# Altium footprint library 6-Connectors-3.PcbLib: 153 footprints (part 7 of 11) (continued)
## PHOENIX_1861073 [mm] "COMBICON PCB Male Header, Pitch 5mm, 4 Positions, Right"
height 16
pads (4):
  round 2.1 hole 1.4: 5(-7.5,0) 6(-2.5,0) 7(2.5,0) 8(7.5,0)
Top Overlay:
  lines w0.2: -9,3.5 1.37,3.5 ; -8.039,-1.4 -9,-1.4 -9,5.157 -7.28,6.15 -6.3,6.15 ; -7.8,5.85 -7.8,5.15 -6.3,5.15 ; -6.961,-1.4 -3.039,-1.4 ; -6.3,7.15 -7.28,7.15 -7.8,7.45 -7.8,8.15 -6.3,8.15 ; -3.9,5.05 -3.9,6.05 -1.1,6.05 -1.1,5.05 ; -3.712,5.05 -3.712,6.05 ; -3.2,3.5 -3.2,2.5 -3,2.7 ; -3,1.414 -3,3.5 ; -3,2.5 -6,2.5 cw(c-6,2.8) -6.3,2.8 -6.3,10.25 -7.2,10.25 -7.2,11.876 -6.7,13.25 -5.905,13.25 -5.593,12.087 -5.593,5.05 -0.3,5.05 -0.3,12.13 0,13.25 7.5,13.25 7.5,12.35 6.98,12.05 1.37,12.05 1.37,2.8 cw(c1.07,2.8) 1.07,2.5 -2,2.5 ; -3,6.05 -3,11.05 ; -2,1.414 -2,3.5 ; -2,2.7 -1.8,2.5 -1.8,3.5 ; -2,6.05 -2,11.05 ; -1.961,-1.4 1.961,-1.4 ; -1.288,5.05 -1.288,6.05 ; -1.086,-0.5 1.086,-0.5 ; -1.086,0.5 1.086,0.5 ; 3.039,-1.4 6.8,-1.4 ; 3.914,-0.5 6.086,-0.5 ; 3.914,0.5 6.086,0.5 ; 6,12.05 6,3.5 8.2,3.5 9,2.7 9,-1.4 8.2,-1.4 ; 6.8,-1.327 6.8,-1.4 ; 6.849,-1.351 6.8,-1.4 ; 8.151,-1.351 8.2,-1.4 ; 8.2,-1.327 8.2,-1.4 ; -3,11.05 -2,11.05 ; -3,11.05 -2.732,12.05 -2.268,12.05 -2,11.05 ; -2.701,4.3 -2.299,4.3 -2.5,5.05 -2.701,4.3
  text "7" at 2.25,-3.025 h1
  text "6" at -2.8,-3.025 h1
  text "5" at -7.825,-3.025 h1
  text "8" at 7.2,-2.972 h1
Mechanical 8:
  lines w0.1: -8.5,0 -7.5,0 -7.5,-1 ; -3.5,0 -2.5,0 -2.5,-1 ; -1,0 0,0 0,1 ; 1.5,0 2.5,0 2.5,-1 ; 6.5,0 7.5,0 7.5,-1
Mechanical 14:
  lines w0.1: -9,3.5 1.37,3.5 ; -7.8,5.85 -7.8,5.15 -6.3,5.15 ; -6.3,6.15 -7.28,6.15 -9,5.157 -9,-1.4 6.8,-1.4 ; -6.3,7.15 -7.28,7.15 -7.8,7.45 -7.8,8.15 -6.3,8.15 ; -3.9,5.05 -3.9,6.05 -1.1,6.05 -1.1,5.05 ; -3.712,5.05 -3.712,6.05 ; -3.2,3.5 -3.2,2.5 -3,2.7 ; -3,2.5 -6,2.5 cw(c-6,2.8) -6.3,2.8 -6.3,10.25 -7.2,10.25 -7.2,11.876 -6.7,13.25 -5.905,13.25 -5.593,12.087 -5.593,5.05 -0.3,5.05 -0.3,12.13 0,13.25 7.5,13.25 7.5,12.35 6.98,12.05 1.37,12.05 1.37,2.8 cw(c1.07,2.8) 1.07,2.5 -2,2.5 ; -3,3.5 -3,0.7 ccw(c-1.8,0.7) -1.8,-0.5 8,-0.5 ; -3,6.05 -3,11.05 ; -2,2.7 -1.8,2.5 -1.8,3.5 ; -2,3.5 -2,0.7 ccw(c-1.8,0.7) -1.8,0.5 8,0.5 ; -2,6.05 -2,11.05 ; -1.288,5.05 -1.288,6.05 ; 6,12.05 6,3.5 8.2,3.5 9,2.7 9,-1.4 8.2,-1.4 ; 6.8,-0.5 6.8,-1.4 ; 6.8,0.5 6.8,0.7 ; 7,-0.5 7,-1.2 6.8,-1.4 ; 7,0.5 6.8,0.7 ; -3,11.05 -2,11.05 ; -3,11.05 -2.732,12.05 -2.268,12.05 -2,11.05 ; 6.8,0.7 8.2,0.7 ; 8,0.5 8.2,0.7 ; 8,0.5 8,-1.2 8.2,-1.4 ; 8.2,-1.4 8.2,0.7 ; -2.701,4.3 -2.299,4.3 -2.5,5.05 -2.701,4.3
  text "8" at 7.2,-2.972 h1
  text "5" at -7.825,-3.025 h1
  text "6" at -2.8,-3.025 h1
  text "7" at 2.25,-3.025 h1
3D body "PHOENIX_1861073.stp": height 15.97, standoff -3.98, extent -9,-1.4 9,13.25

## PHOENIX_1862713 [mm] "PHOENIX IMC Series, Pitch 3.81mm, 8A, 160V, 16 Positions Header"
height 6.85
pads (32):
  round 1.9 hole 1.2: 1(-28.575,-1.27) 1(-28.575,1.27) 2(-24.765,-1.27) 2(-24.765,1.27) 3(-20.955,-1.27) 3(-20.955,1.27) 4(-17.145,-1.27) 4(-17.145,1.27) 5(-13.335,-1.27) 5(-13.335,1.27) 6(-9.525,-1.27) 6(-9.525,1.27) 7(-5.715,-1.27) 7(-5.715,1.27) 8(-1.905,-1.27) 8(-1.905,1.27) 9(1.905,-1.27) 9(1.905,1.27) 10(5.715,-1.27) 10(5.715,1.27) 11(9.525,-1.27) 11(9.525,1.27) 12(13.335,-1.27) 12(13.335,1.27) 13(17.145,-1.27) 13(17.145,1.27) 14(20.955,-1.27) 14(20.955,1.27) 15(24.765,-1.27) 15(24.765,1.27) 16(28.575,-1.27) 16(28.575,1.27)
Top Overlay:
  drawing of 165 lines, arcs and shapes, not listed
  text "12" at 12.7,3.683 h1
  text "11" at 8.89,3.683 h1
  text "3" at -21.209,3.683 h1
  text "2" at -25.019,3.683 h1
  text "1" at -28.829,3.683 h1
  text "4" at -17.399,3.683 h1
  text "7" at -5.969,3.683 h1
  text "6" at -9.779,3.683 h1
  text "5" at -13.589,3.683 h1
  text "8" at -2.159,3.683 h1
  text "9" at 1.651,3.683 h1
  text "10" at 5.08,3.683 h1
  text "13" at 16.51,3.683 h1
  text "14" at 20.32,3.683 h1
  text "15" at 24.13,3.683 h1
  text "16" at 27.94,3.683 h1
Mechanical 8:
  circle w0.1: c-28.575,-1.27 r0.95
  circle w0.1: c-28.575,-1.27 r0.6
  lines w0.1: -29.575,-1.27 -28.575,-1.27 -28.575,-2.27 ; -29.575,1.27 -28.575,1.27 -28.575,0.27 ; -25.765,-1.27 -24.765,-1.27 -24.765,-2.27 ; -25.765,1.27 -24.765,1.27 -24.765,0.27 ; -21.955,-1.27 -20.955,-1.27 -20.955,-2.27 ; -21.955,1.27 -20.955,1.27 -20.955,0.27 ; -18.145,-1.27 -17.145,-1.27 -17.145,-2.27 ; -18.145,1.27 -17.145,1.27 -17.145,0.27 ; -14.335,-1.27 -13.335,-1.27 -13.335,-2.27 ; -14.335,1.27 -13.335,1.27 -13.335,0.27 ; -10.525,-1.27 -9.525,-1.27 -9.525,-2.27 ; -10.525,1.27 -9.525,1.27 -9.525,0.27 ; -6.715,-1.27 -5.715,-1.27 -5.715,-2.27 ; -6.715,1.27 -5.715,1.27 -5.715,0.27 ; -2.905,-1.27 -1.905,-1.27 -1.905,-2.27 ; -2.905,1.27 -1.905,1.27 -1.905,0.27 ; -1,0 0,0 0,-1 ; 0.905,-1.27 1.905,-1.27 1.905,-2.27 ; 0.905,1.27 1.905,1.27 1.905,0.27 ; 4.715,-1.27 5.715,-1.27 5.715,-2.27 ; 4.715,1.27 5.715,1.27 5.715,0.27 ; 8.525,-1.27 9.525,-1.27 9.525,-2.27 ; 8.525,1.27 9.525,1.27 9.525,0.27 ; 12.335,-1.27 13.335,-1.27 13.335,-2.27 ; 12.335,1.27 13.335,1.27 13.335,0.27 ; 16.145,-1.27 17.145,-1.27 17.145,-2.27 ; 16.145,1.27 17.145,1.27 17.145,0.27 ; 19.955,-1.27 20.955,-1.27 20.955,-2.27 ; 19.955,1.27 20.955,1.27 20.955,0.27 ; 23.765,-1.27 24.765,-1.27 24.765,-2.27 ; 23.765,1.27 24.765,1.27 24.765,0.27 ; 27.575,-1.27 28.575,-1.27 28.575,-2.27 ; 27.575,1.27 28.575,1.27 28.575,0.27
Mechanical 14:
  drawing of 274 lines, arcs and shapes, not listed
3D body "PHOENIX_1862713.stp": height 6.85, standoff -3.4, extent -30.875,-11.37 30.875,3.13

## PHOENIX_1869127 [mm] "PC Terminal Block, Pitch 5mm, 8 Positions, Screw Connection"
height 11
pads (8):
  round 2 hole 1.3: 1(-17.5,0) 2(-12.5,0) 3(-7.5,0) 4(-2.5,0) 5(2.5,0) 6(7.5,0) 7(12.5,0) 8(17.5,0)
Top Overlay:
  drawing of 1168 lines, arcs and shapes, not listed
  text "8" at 17.167,6.65 h1.2
  text "7" at 12.167,6.65 h1.2
  text "6" at 7.19,6.65 h1.2
  text "5" at 2.167,6.65 h1.2
  text "4" at -2.857,6.65 h1.2
  text "3" at -7.833,6.65 h1.2
  text "2" at -12.833,6.65 h1.2
  text "1" at -17.619,6.65 h1.2
Mechanical 8:
  lines w0.1: -18,0 -17.5,0 ; -17.5,-0.5 -17.5,0 ; -17.5,0.5 -17.5,0 ; -17,0 -17.5,0 ; -13,0 -12.5,0 ; -12.5,-0.5 -12.5,0 ; -12.5,0.5 -12.5,0 ; -12,0 -12.5,0 ; -8,0 -7.5,0 ; -7.5,-0.5 -7.5,0 ; -7.5,0.5 -7.5,0 ; -7,0 -7.5,0 ; -3,0 -2.5,0 ; -2.5,-0.5 -2.5,0 ; -2.5,0.5 -2.5,0 ; -2,0 -2.5,0 ; -0.5,0 0,0 ; 0,-0.5 0,0 ; 0,0.5 0,0 ; 0.5,0 0,0 ; 2,0 2.5,0 ; 2.5,-0.5 2.5,0 ; 2.5,0.5 2.5,0 ; 3,0 2.5,0 ; 7,0 7.5,0 ; 7.5,-0.5 7.5,0 ; 7.5,0.5 7.5,0 ; 8,0 7.5,0 ; 12,0 12.5,0 ; 12.5,-0.5 12.5,0 ; 12.5,0.5 12.5,0 ; 13,0 12.5,0 ; 17,0 17.5,0 ; 17.5,-0.5 17.5,0 ; 17.5,0.5 17.5,0 ; 18,0 17.5,0
Mechanical 14:
  drawing of 1168 lines, arcs and shapes, not listed
  text "1" at -17.619,6.65 h1.2
  text "2" at -12.833,6.65 h1.2
  text "3" at -7.833,6.65 h1.2
  text "4" at -2.857,6.65 h1.2
  text "5" at 2.167,6.65 h1.2
  text "6" at 7.19,6.65 h1.2
  text "7" at 12.167,6.65 h1.2
  text "8" at 17.167,6.65 h1.2
3D body "PHOENIX_1869127.stp": height 11, standoff -3.5, extent -20.5,-6 20.5,6

## PHOENIX_1881477 [mm] "PHOENIX MC Serie, Pitch 2.5mm, 4A, 80V, 5 Positions Header"
height 8.1
pads (5):
  round 1.9 hole 1.2: 1(-5,0) 2(-2.5,0) 3(0,0) 4(2.5,0) 5(5,0)
Top Overlay:
  lines w0.2: -7.2,-5.7 7.2,-5.7 ; -7.2,-5.5 7.2,-5.5 ; -7.2,0.7 -5.912,0.7 ; -4.088,0.7 -3.412,0.7 ; -1.588,0.7 -0.912,0.7 ; 0.912,0.7 1.588,0.7 ; 3.412,0.7 4.088,0.7 ; 5.912,0.7 7.2,0.7 ; -7.2,-8.9 -7.2,1.2 7.2,1.2 7.2,-8.9 -7.2,-8.9 ; -3.951,-2.35 -3.549,-2.35 -3.75,-3.1 -3.951,-2.35 ; -1.451,-2.35 -1.049,-2.35 -1.25,-3.1 -1.451,-2.35 ; 1.049,-2.35 1.451,-2.35 1.25,-3.1 1.049,-2.35 ; 3.549,-2.35 3.951,-2.35 3.75,-3.1 3.549,-2.35
  text "5" at 4.683,-2.35 h1
  text "4" at 2.183,-2.35 h1
  text "3" at -0.317,-2.35 h1
  text "2" at -2.817,-2.35 h1
  text "1" at -5.017,-2.35 h1
Mechanical 8:
  lines w0.1: -5.5,0 -5,0 ; -5,-0.5 -5,0 ; -5,0.5 -5,0 ; -4.5,0 -5,0 ; -3,0 -2.5,0 ; -2.5,-0.5 -2.5,0 ; -2.5,0.5 -2.5,0 ; -2,0 -2.5,0 ; -0.5,0 0,0 ; 0,-0.5 0,0 ; 0,0.5 0,0 ; 0.5,0 0,0 ; 2,0 2.5,0 ; 2.5,-0.5 2.5,0 ; 2.5,0.5 2.5,0 ; 3,0 2.5,0 ; 4.5,0 5,0 ; 5,-0.5 5,0 ; 5,0.5 5,0 ; 5.5,0 5,0
Mechanical 14:
  lines w0.1: -7.2,-5.7 7.2,-5.7 ; -7.2,-5.5 7.2,-5.5 ; -7.2,0.7 7.2,0.7 ; -7.2,-8.9 -7.2,1.2 7.2,1.2 7.2,-8.9 -7.2,-8.9 ; -3.951,-2.35 -3.549,-2.35 -3.75,-3.1 -3.951,-2.35 ; -1.451,-2.35 -1.049,-2.35 -1.25,-3.1 -1.451,-2.35 ; 1.049,-2.35 1.451,-2.35 1.25,-3.1 1.049,-2.35 ; 3.549,-2.35 3.951,-2.35 3.75,-3.1 3.549,-2.35
3D body "PHOENIX_1881477.stp": height 8.1, standoff -3.5, extent -7.2,-8.9 7.2,1.2

## PHOENIX_1881590 [mm] "PHOENIX MCV Serie, Pitch 2.5mm, 4A, 160V, 6 Positions Header"
height 10.1
pads (6):
  round 1.9 hole 1.2: 1(-6.25,0) 2(-3.75,0) 3(-1.25,0) 4(1.25,0) 5(3.75,0) 6(6.25,0)
Top Overlay:
  lines w0.2: -8.45,3.7 8.45,3.7 ; -7.4,-2 7.4,-2 ; -7.4,2 -6.6,2 -6.6,2.5 ccw(c-6.8,2.5) -6.8,2.7 ; -6.6,2.134 -7.4,2.134 -7.4,-2.134 -6.15,-2.134 ; -6.15,-2 -6.15,-3.1 -5,-3.1 -5,-2 ; -5.9,2.134 -4.1,2.134 ; -5.7,2.7 ccw(c-5.7,2.5) -5.9,2.5 -5.9,2 -4.1,2 -4.1,2.5 ccw(c-4.3,2.5) -4.3,2.7 ; -5,-2.134 6.35,-2.134 ; -3.4,2.134 -1.6,2.134 ; -3.2,2.7 ccw(c-3.2,2.5) -3.4,2.5 -3.4,2 -1.6,2 -1.6,2.5 ccw(c-1.8,2.5) -1.8,2.7 ; -0.9,2.134 0.9,2.134 ; -0.7,2.7 ccw(c-0.7,2.5) -0.9,2.5 -0.9,2 0.9,2 0.9,2.5 ccw(c0.7,2.5) 0.7,2.7 ; 1.6,2.134 3.4,2.134 ; 1.8,2.7 ccw(c1.8,2.5) 1.6,2.5 1.6,2 3.4,2 3.4,2.5 ccw(c3.2,2.5) 3.2,2.7 ; 4.1,2.134 5.9,2.134 ; 4.3,2.7 ccw(c4.3,2.5) 4.1,2.5 4.1,2 5.9,2 5.9,2.5 ccw(c5.7,2.5) 5.7,2.7 ; 6.35,-2 6.35,-3.1 7.4,-3.1 7.4,2.134 6.6,2.134 ; 6.8,2.7 ccw(c6.8,2.5) 6.6,2.5 6.6,2 7.4,2 ; -8.45,-3.9 -8.45,4.2 8.45,4.2 8.45,-3.9 -8.45,-3.9 ; -7.25,2.7 -7.25,3.35 -5.25,3.35 -5.25,2.7 -7.25,2.7 ; -5.201,-0.75 -5,0 -4.799,-0.75 -5.201,-0.75 ; -4.75,2.7 -4.75,3.35 -2.75,3.35 -2.75,2.7 -4.75,2.7 ; -2.701,-0.75 -2.5,0 -2.299,-0.75 -2.701,-0.75 ; -2.25,2.7 -2.25,3.35 -0.25,3.35 -0.25,2.7 -2.25,2.7 ; -0.201,-0.75 0,0 0.201,-0.75 -0.201,-0.75 ; 0.25,2.7 0.25,3.35 2.25,3.35 2.25,2.7 0.25,2.7 ; 2.299,-0.75 2.5,0 2.701,-0.75 2.299,-0.75 ; 2.75,2.7 2.75,3.35 4.75,3.35 4.75,2.7 2.75,2.7 ; 4.799,-0.75 5,0 5.201,-0.75 4.799,-0.75 ; 5.25,2.7 5.25,3.35 7.25,3.35 7.25,2.7 5.25,2.7
  text "6" at 5.975,4.6 h1
  text "4" at 0.975,4.6 h1
  text "1" at -6.525,4.6 h1
  text "2" at -4.025,4.6 h1
  text "3" at -1.525,4.6 h1
  text "5" at 3.475,4.6 h1
Mechanical 8:
  lines w0.05: -6.75,0 -6.25,0 ; -6.25,-0.5 -6.25,0 ; -6.25,0.5 -6.25,0 ; -5.75,0 -6.25,0 ; -4.25,0 -3.75,0 ; -3.75,-0.5 -3.75,0 ; -3.75,0.5 -3.75,0 ; -3.25,0 -3.75,0 ; -1.75,0 -1.25,0 ; -1.25,-0.5 -1.25,0 ; -1.25,0.5 -1.25,0 ; -0.75,0 -1.25,0 ; -0.5,0 0,0 ; 0,-0.5 0,0 ; 0,0.5 0,0 ; 0.5,0 0,0 ; 0.75,0 1.25,0 ; 1.25,-0.5 1.25,0 ; 1.25,0.5 1.25,0 ; 1.75,0 1.25,0 ; 3.25,0 3.75,0 ; 3.75,-0.5 3.75,0 ; 3.75,0.5 3.75,0 ; 4.25,0 3.75,0 ; 5.75,0 6.25,0 ; 6.25,-0.5 6.25,0 ; 6.25,0.5 6.25,0 ; 6.75,0 6.25,0
Mechanical 14:
  lines w0.1: -8.45,3.7 8.45,3.7 ; -7.4,-2 7.4,-2 ; -7.4,2 -6.6,2 -6.6,2.5 ccw(c-6.8,2.5) -6.8,2.7 ; -6.6,2.134 -7.4,2.134 -7.4,-2.134 -6.15,-2.134 ; -6.15,-2 -6.15,-3.1 -5,-3.1 -5,-2 ; -5.9,2.134 -4.1,2.134 ; -5.7,2.7 ccw(c-5.7,2.5) -5.9,2.5 -5.9,2 -4.1,2 -4.1,2.5 ccw(c-4.3,2.5) -4.3,2.7 ; -5,-2.134 6.35,-2.134 ; -3.4,2.134 -1.6,2.134 ; -3.2,2.7 ccw(c-3.2,2.5) -3.4,2.5 -3.4,2 -1.6,2 -1.6,2.5 ccw(c-1.8,2.5) -1.8,2.7 ; -0.9,2.134 0.9,2.134 ; -0.7,2.7 ccw(c-0.7,2.5) -0.9,2.5 -0.9,2 0.9,2 0.9,2.5 ccw(c0.7,2.5) 0.7,2.7 ; 1.6,2.134 3.4,2.134 ; 1.8,2.7 ccw(c1.8,2.5) 1.6,2.5 1.6,2 3.4,2 3.4,2.5 ccw(c3.2,2.5) 3.2,2.7 ; 4.1,2.134 5.9,2.134 ; 4.3,2.7 ccw(c4.3,2.5) 4.1,2.5 4.1,2 5.9,2 5.9,2.5 ccw(c5.7,2.5) 5.7,2.7 ; 6.35,-2 6.35,-3.1 7.4,-3.1 7.4,2.134 6.6,2.134 ; 6.8,2.7 ccw(c6.8,2.5) 6.6,2.5 6.6,2 7.4,2 ; -8.45,-3.9 -8.45,4.2 8.45,4.2 8.45,-3.9 -8.45,-3.9 ; -7.25,2.7 -7.25,3.35 -5.25,3.35 -5.25,2.7 -7.25,2.7 ; -5.201,-0.75 -5,0 -4.799,-0.75 -5.201,-0.75 ; -4.75,2.7 -4.75,3.35 -2.75,3.35 -2.75,2.7 -4.75,2.7 ; -2.701,-0.75 -2.5,0 -2.299,-0.75 -2.701,-0.75 ; -2.25,2.7 -2.25,3.35 -0.25,3.35 -0.25,2.7 -2.25,2.7 ; -0.201,-0.75 0,0 0.201,-0.75 -0.201,-0.75 ; 0.25,2.7 0.25,3.35 2.25,3.35 2.25,2.7 0.25,2.7 ; 2.299,-0.75 2.5,0 2.701,-0.75 2.299,-0.75 ; 2.75,2.7 2.75,3.35 4.75,3.35 4.75,2.7 2.75,2.7 ; 4.799,-0.75 5,0 5.201,-0.75 4.799,-0.75 ; 5.25,2.7 5.25,3.35 7.25,3.35 7.25,2.7 5.25,2.7
3D body "PHOENIX_1881590.stp": height 10.1, standoff -3.5, extent -8.45,-3.9 8.45,4.2

## PHOENIX_1881613 [mm] "MICRO COMBICON PCB Header, 4 A 80 V, Pitch: 2.5 mm, 8 Positions"
height 10.1
pads (8):
  round 1.9 hole 1.2: 1(-8.75,0) 2(-6.25,0) 3(-3.75,0) 4(-1.25,0) 5(1.25,0) 6(3.75,0) 7(6.25,0) 8(8.75,0)
Top Overlay:
  lines w0.2: -10.95,3.7 10.95,3.7 ; -9.9,-2 9.9,-2 ; -9.9,2 -9.1,2 -9.1,2.5 ccw(c-9.3,2.5) -9.3,2.7 ; -9.1,2.134 -9.9,2.134 -9.9,-2.134 -8.65,-2.134 ; -8.65,-2 -8.65,-3.1 -7.5,-3.1 -7.5,-2 ; -8.4,2.134 -6.6,2.134 ; -8.2,2.7 ccw(c-8.2,2.5) -8.4,2.5 -8.4,2 -6.6,2 -6.6,2.5 ccw(c-6.8,2.5) -6.8,2.7 ; -7.5,-2.134 8.85,-2.134 ; -5.9,2.134 -4.1,2.134 ; -5.7,2.7 ccw(c-5.7,2.5) -5.9,2.5 -5.9,2 -4.1,2 -4.1,2.5 ccw(c-4.3,2.5) -4.3,2.7 ; -3.4,2.134 -1.6,2.134 ; -3.2,2.7 ccw(c-3.2,2.5) -3.4,2.5 -3.4,2 -1.6,2 -1.6,2.5 ccw(c-1.8,2.5) -1.8,2.7 ; -0.9,2.134 0.9,2.134 ; -0.7,2.7 ccw(c-0.7,2.5) -0.9,2.5 -0.9,2 0.9,2 0.9,2.5 ccw(c0.7,2.5) 0.7,2.7 ; 1.6,2.134 3.4,2.134 ; 1.8,2.7 ccw(c1.8,2.5) 1.6,2.5 1.6,2 3.4,2 3.4,2.5 ccw(c3.2,2.5) 3.2,2.7 ; 4.1,2.134 5.9,2.134 ; 4.3,2.7 ccw(c4.3,2.5) 4.1,2.5 4.1,2 5.9,2 5.9,2.5 ccw(c5.7,2.5) 5.7,2.7 ; 6.6,2.134 8.4,2.134 ; 6.8,2.7 ccw(c6.8,2.5) 6.6,2.5 6.6,2 8.4,2 8.4,2.5 ccw(c8.2,2.5) 8.2,2.7 ; 8.85,-2 8.85,-3.1 9.9,-3.1 9.9,2.134 9.1,2.134 ; 9.3,2.7 ccw(c9.3,2.5) 9.1,2.5 9.1,2 9.9,2 ; -10.95,-3.9 10.95,-3.9 10.95,4.2 -10.95,4.2 -10.95,-3.9 ; -9.75,2.7 -7.75,2.7 -7.75,3.35 -9.75,3.35 -9.75,2.7 ; -7.701,-0.75 -7.5,0 -7.299,-0.75 -7.701,-0.75 ; -7.25,2.7 -5.25,2.7 -5.25,3.35 -7.25,3.35 -7.25,2.7 ; -5.201,-0.75 -5,0 -4.799,-0.75 -5.201,-0.75 ; -4.75,2.7 -2.75,2.7 -2.75,3.35 -4.75,3.35 -4.75,2.7 ; -2.701,-0.75 -2.5,0 -2.299,-0.75 -2.701,-0.75 ; -2.25,2.7 -0.25,2.7 -0.25,3.35 -2.25,3.35 -2.25,2.7 ; -0.201,-0.75 0,0 0.201,-0.75 -0.201,-0.75 ; 0.25,2.7 2.25,2.7 2.25,3.35 0.25,3.35 0.25,2.7 ; 2.299,-0.75 2.5,0 2.701,-0.75 2.299,-0.75 ; 2.75,2.7 4.75,2.7 4.75,3.35 2.75,3.35 2.75,2.7 ; 4.799,-0.75 5,0 5.201,-0.75 4.799,-0.75 ; 5.25,2.7 7.25,2.7 7.25,3.35 5.25,3.35 5.25,2.7 ; 7.299,-0.75 7.5,0 7.701,-0.75 7.299,-0.75 ; 7.75,2.7 9.75,2.7 9.75,3.35 7.75,3.35 7.75,2.7
  text "8" at 8.475,4.6 h1
  text "6" at 3.475,4.6 h1
  text "4" at -1.525,4.6 h1
  text "1" at -9.025,4.6 h1
  text "2" at -6.525,4.6 h1
  text "3" at -4.025,4.6 h1
  text "5" at 0.975,4.6 h1
  text "7" at 5.975,4.6 h1
Mechanical 8:
  lines w0.1: -9.75,0 -8.75,0 ; -8.75,-1 -8.75,0 ; -8.75,1 -8.75,0 ; -7.75,0 -8.75,0 ; -7.25,0 -6.25,0 ; -6.25,-1 -6.25,0 ; -6.25,1 -6.25,0 ; -5.25,0 -6.25,0 ; -4.75,0 -3.75,0 ; -3.75,-1 -3.75,0 ; -3.75,1 -3.75,0 ; -2.75,0 -3.75,0 ; -2.25,0 -1.25,0 ; -1.25,-1 -1.25,0 ; -1.25,1 -1.25,0 ; -1,0 0,0 ; -0.25,0 -1.25,0 ; 0,-1 0,0 ; 0,1 0,0 ; 0.25,0 1.25,0 ; 1,0 0,0 ; 1.25,-1 1.25,0 ; 1.25,1 1.25,0 ; 2.25,0 1.25,0 ; 2.75,0 3.75,0 ; 3.75,-1 3.75,0 ; 3.75,1 3.75,0 ; 4.75,0 3.75,0 ; 5.25,0 6.25,0 ; 6.25,-1 6.25,0 ; 6.25,1 6.25,0 ; 7.25,0 6.25,0 ; 7.75,0 8.75,0 ; 8.75,-1 8.75,0 ; 8.75,1 8.75,0 ; 9.75,0 8.75,0
Mechanical 14:
  lines w0.1: -10.95,3.7 10.95,3.7 ; -9.9,-2 9.9,-2 ; -9.9,2 -9.1,2 -9.1,2.5 ccw(c-9.3,2.5) -9.3,2.7 ; -9.1,2.134 -9.9,2.134 -9.9,-2.134 -8.65,-2.134 ; -8.65,-2 -8.65,-3.1 -7.5,-3.1 -7.5,-2 ; -8.4,2.134 -6.6,2.134 ; -8.2,2.7 ccw(c-8.2,2.5) -8.4,2.5 -8.4,2 -6.6,2 -6.6,2.5 ccw(c-6.8,2.5) -6.8,2.7 ; -7.5,-2.134 8.85,-2.134 ; -5.9,2.134 -4.1,2.134 ; -5.7,2.7 ccw(c-5.7,2.5) -5.9,2.5 -5.9,2 -4.1,2 -4.1,2.5 ccw(c-4.3,2.5) -4.3,2.7 ; -3.4,2.134 -1.6,2.134 ; -3.2,2.7 ccw(c-3.2,2.5) -3.4,2.5 -3.4,2 -1.6,2 -1.6,2.5 ccw(c-1.8,2.5) -1.8,2.7 ; -0.9,2.134 0.9,2.134 ; -0.7,2.7 ccw(c-0.7,2.5) -0.9,2.5 -0.9,2 0.9,2 0.9,2.5 ccw(c0.7,2.5) 0.7,2.7 ; 1.6,2.134 3.4,2.134 ; 1.8,2.7 ccw(c1.8,2.5) 1.6,2.5 1.6,2 3.4,2 3.4,2.5 ccw(c3.2,2.5) 3.2,2.7 ; 4.1,2.134 5.9,2.134 ; 4.3,2.7 ccw(c4.3,2.5) 4.1,2.5 4.1,2 5.9,2 5.9,2.5 ccw(c5.7,2.5) 5.7,2.7 ; 6.6,2.134 8.4,2.134 ; 6.8,2.7 ccw(c6.8,2.5) 6.6,2.5 6.6,2 8.4,2 8.4,2.5 ccw(c8.2,2.5) 8.2,2.7 ; 8.85,-2 8.85,-3.1 9.9,-3.1 9.9,2.134 9.1,2.134 ; 9.3,2.7 ccw(c9.3,2.5) 9.1,2.5 9.1,2 9.9,2 ; -10.95,-3.9 10.95,-3.9 10.95,4.2 -10.95,4.2 -10.95,-3.9 ; -9.75,2.7 -7.75,2.7 -7.75,3.35 -9.75,3.35 -9.75,2.7 ; -7.701,-0.75 -7.5,0 -7.299,-0.75 -7.701,-0.75 ; -7.25,2.7 -5.25,2.7 -5.25,3.35 -7.25,3.35 -7.25,2.7 ; -5.201,-0.75 -5,0 -4.799,-0.75 -5.201,-0.75 ; -4.75,2.7 -2.75,2.7 -2.75,3.35 -4.75,3.35 -4.75,2.7 ; -2.701,-0.75 -2.5,0 -2.299,-0.75 -2.701,-0.75 ; -2.25,2.7 -0.25,2.7 -0.25,3.35 -2.25,3.35 -2.25,2.7 ; -0.201,-0.75 0,0 0.201,-0.75 -0.201,-0.75 ; 0.25,2.7 2.25,2.7 2.25,3.35 0.25,3.35 0.25,2.7 ; 2.299,-0.75 2.5,0 2.701,-0.75 2.299,-0.75 ; 2.75,2.7 4.75,2.7 4.75,3.35 2.75,3.35 2.75,2.7 ; 4.799,-0.75 5,0 5.201,-0.75 4.799,-0.75 ; 5.25,2.7 7.25,2.7 7.25,3.35 5.25,3.35 5.25,2.7 ; 7.299,-0.75 7.5,0 7.701,-0.75 7.299,-0.75 ; 7.75,2.7 9.75,2.7 9.75,3.35 7.75,3.35 7.75,2.7
3D body "PHOENIX_1881613.stp": height 10.1, standoff -3.5, extent -10.95,-3.9 10.95,4.2

## PHOENIX_1881655 [mm] "PCB Header, 4A, 160 V, Pitch: 2.5mm, 12 Positions, MCV Serie"
height 10.1
pads (12):
  round 1.9 hole 1.2: 1(-13.75,0) 2(-11.25,0) 3(-8.75,0) 4(-6.25,0) 5(-3.75,0) 6(-1.25,0) 7(1.25,0) 8(3.75,0) 9(6.25,0) 10(8.75,0) 11(11.25,0) 12(13.75,0)
Top Overlay:
  drawing of 186 lines, arcs and shapes, not listed
  text "1" at -13.61,4.7 h1
  text "12" at 13.06,4.7 h1
  text "11" at 10.56,4.7 h1
  text "10" at 8.06,4.7 h1
  text "9" at 5.91,4.725 h1
  text "8" at 3.41,4.725 h1
  text "7" at 0.91,4.725 h1
  text "6" at -1.59,4.725 h1
  text "5" at -4.09,4.725 h1
  text "4" at -6.59,4.725 h1
  text "3" at -9.09,4.725 h1
  text "2" at -11.59,4.725 h1
Mechanical 8:
  lines w0.1: -14.25,0 -13.75,0 ; -13.75,-0.5 -13.75,0 ; -13.75,0.5 -13.75,0 ; -13.25,0 -13.75,0 ; -11.75,0 -11.25,0 ; -11.25,-0.5 -11.25,0 ; -11.25,0.5 -11.25,0 ; -10.75,0 -11.25,0 ; -9.25,0 -8.75,0 ; -8.75,-0.5 -8.75,0 ; -8.75,0.5 -8.75,0 ; -8.25,0 -8.75,0 ; -6.75,0 -6.25,0 ; -6.25,-0.5 -6.25,0 ; -6.25,0.5 -6.25,0 ; -5.75,0 -6.25,0 ; -4.25,0 -3.75,0 ; -3.75,-0.5 -3.75,0 ; -3.75,0.5 -3.75,0 ; -3.25,0 -3.75,0 ; -1.75,0 -1.25,0 ; -1.25,-0.5 -1.25,0 ; -1.25,0.5 -1.25,0 ; -0.75,0 -1.25,0 ; -0.5,0 0,0 ; 0,-0.5 0,0 ; 0,0.5 0,0 ; 0.5,0 0,0 ; 0.75,0 1.25,0 ; 1.25,-0.5 1.25,0 ; 1.25,0.5 1.25,0 ; 1.75,0 1.25,0 ; 3.25,0 3.75,0 ; 3.75,-0.5 3.75,0 ; 3.75,0.5 3.75,0 ; 4.25,0 3.75,0 ; 5.75,0 6.25,0 ; 6.25,-0.5 6.25,0 ; 6.25,0.5 6.25,0 ; 6.75,0 6.25,0 ; 8.25,0 8.75,0 ; 8.75,-0.5 8.75,0 ; 8.75,0.5 8.75,0 ; 9.25,0 8.75,0 ; 10.75,0 11.25,0 ; 11.25,-0.5 11.25,0 ; 11.25,0.5 11.25,0 ; 11.75,0 11.25,0 ; 13.25,0 13.75,0 ; 13.75,-0.5 13.75,0 ; 13.75,0.5 13.75,0 ; 14.25,0 13.75,0
Mechanical 14:
  drawing of 280 lines, arcs and shapes, not listed
  text "12" at 13.06,4.7 h1
  text "1" at -13.61,4.7 h1
  text "11" at 10.56,4.7 h1
  text "10" at 8.06,4.7 h1
  text "9" at 5.91,4.725 h1
  text "8" at 3.41,4.725 h1
  text "7" at 0.91,4.725 h1
  text "6" at -1.59,4.725 h1
  text "5" at -4.09,4.725 h1
  text "4" at -6.59,4.725 h1
  text "3" at -9.09,4.725 h1
  text "2" at -11.59,4.725 h1
3D body "PHOENIX_1881655.stp": height 10.1, standoff -3.5, extent -15.95,-3.9 15.95,4.2

## PHOENIX_1911017 [mm] "8A, 160V, Pitch 3.5mm, 2 Positions Press-in Header"
height 9.2
pads (2):
  round 2 hole 1.3: 1(-1.75,0) 2(1.75,0)
Top Overlay:
  lines w0.2: -3.3,-2.3 -2.65,-2.3 ; -3.3,2 -2.15,2 -2.15,2.47 ccw(c-2.35,2.47) -2.35,2.67 ; -2.15,2.134 -3.3,2.134 -3.3,-2.434 -2.604,-2.434 ; -1.35,2.134 -0.2,2.134 -0.2,-2.434 -0.896,-2.434 ; -1.15,2.67 ccw(c-1.15,2.47) -1.35,2.47 -1.35,2 -0.2,2 ; -0.2,-2.3 -0.85,-2.3 ; 0.2,-2.3 0.85,-2.3 ; 0.2,2 1.35,2 1.35,2.47 ccw(c1.15,2.47) 1.15,2.67 ; 1.35,2.134 0.2,2.134 0.2,-2.434 0.896,-2.434 ; 2.15,2.134 3.3,2.134 3.3,-2.434 2.604,-2.434 ; 2.35,2.67 ccw(c2.35,2.47) 2.15,2.47 2.15,2 3.3,2 ; 3.3,-2.3 2.65,-2.3 ; -2.65,-2.3 cw(c-1.75,-3.5) -0.85,-2.3 ; -2.65,-2.3 -2.604,-2.434 ; -2.604,-2.434 cw(c-1.75,-3.5) -0.896,-2.434 ; -0.896,-2.434 -0.85,-2.3 ; 0.85,-2.3 cw(c1.75,-3.5) 2.65,-2.3 ; 0.85,-2.3 0.896,-2.434 ; 0.896,-2.434 cw(c1.75,-3.5) 2.604,-2.434 ; 2.604,-2.434 2.65,-2.3 ; -4.2,-3 -4.2,4.25 4.2,4.25 4.2,-3 -4.2,-3 ; -3.24,3.35 -3.005,2.67 -0.495,2.67 -0.26,3.35 -3.24,3.35 ; 0.26,3.35 0.495,2.67 3.005,2.67 3.24,3.35 0.26,3.35
  text "1" at -5.225,2.8 h1.2
Mechanical 8:
  lines w0.1: -2.25,0 -1.75,0 ; -1.75,-0.5 -1.75,0 ; -1.75,0.5 -1.75,0 ; -1.25,0 -1.75,0 ; -0.5,0 0,0 ; 0,-0.5 0,0 ; 0,0.5 0,0 ; 0.5,0 0,0 ; 1.25,0 1.75,0 ; 1.75,-0.5 1.75,0 ; 1.75,0.5 1.75,0 ; 2.25,0 1.75,0
Mechanical 14:
  circle w0.1: c1.75,0 r0.8
  lines w0.1: -3.3,-2.3 -2.65,-2.3 ; -3.3,2 -2.15,2 -2.15,2.47 ccw(c-2.35,2.47) -2.35,2.67 ; -2.15,2.134 -3.3,2.134 -3.3,-2.434 -2.604,-2.434 ; -1.618,-0.132 -1.35,-0.4 ; -1.35,2.134 -0.2,2.134 -0.2,-2.434 -0.896,-2.434 ; -1.15,2.67 ccw(c-1.15,2.47) -1.35,2.47 -1.35,2 -0.2,2 ; -0.2,-2.3 -0.85,-2.3 ; 0.2,-2.3 0.85,-2.3 ; 0.2,2 1.35,2 1.35,2.47 ccw(c1.15,2.47) 1.15,2.67 ; 1.35,2.134 0.2,2.134 0.2,-2.434 0.896,-2.434 ; 1.882,-0.132 2.15,-0.4 ; 2.15,2.134 3.3,2.134 3.3,-2.434 2.604,-2.434 ; 2.35,2.67 ccw(c2.35,2.47) 2.15,2.47 2.15,2 3.3,2 ; 3.3,-2.3 2.65,-2.3 ; -2.65,-2.3 cw(c-1.75,-3.5) -0.85,-2.3 ; -2.65,-2.3 -2.604,-2.434 ; -2.604,-2.434 cw(c-1.75,-3.5) -0.896,-2.434 ; -2.15,-0.4 -1.89,-0.14 ; -2.15,-0.4 -2.15,0.4 ; -2.15,-0.4 -1.35,-0.4 ; -2.15,0.4 -1.89,0.14 ; -2.15,0.4 -1.35,0.4 ; -1.89,-0.14 -1.61,-0.14 -1.61,0.14 ; -1.89,-0.14 -1.89,0.14 ; -1.89,0.14 -1.61,0.14 ; -1.61,0.14 -1.35,0.4 ; -1.35,-0.4 -1.35,0.4 ; -0.896,-2.434 -0.85,-2.3 ; 0.85,-2.3 cw(c1.75,-3.5) 2.65,-2.3 ; 0.85,-2.3 0.896,-2.434 ; 0.896,-2.434 cw(c1.75,-3.5) 2.604,-2.434 ; 1.35,-0.4 1.61,-0.14 ; 1.35,-0.4 1.35,0.4 ; 1.35,-0.4 2.15,-0.4 ; 1.35,0.4 1.61,0.14 ; 1.35,0.4 2.15,0.4 ; 1.61,-0.14 1.89,-0.14 1.89,0.14 ; 1.61,-0.14 1.61,0.14 ; 1.61,0.14 1.89,0.14 ; 1.89,0.14 2.15,0.4 ; 2.15,-0.4 2.15,0.4 ; 2.604,-2.434 2.65,-2.3 ; -4.2,-3 -4.2,4.25 4.2,4.25 4.2,-3 -4.2,-3 ; -3.24,3.35 -3.005,2.67 -0.495,2.67 -0.26,3.35 -3.24,3.35 ; -2.25,-0.625 ccw(c-1.75,0) -2.25,0.625 -2.25,-0.624 ; 0.26,3.35 0.495,2.67 3.005,2.67 3.24,3.35 0.26,3.35
  text "1" at -5.225,2.8 h1.2
Drill Drawing:
  lines w0.1: -4.2,-3 4.2,-3 4.2,4.25 -4.2,4.25 -4.2,-3
  text "+0.09 -0.06" at -3.65,1.725 h0.8
  text "PRESS-FIT" at -2.925,-2.575 h0.8
  text "diam. 1.3mm" at -3.7,3.025 h0.8
3D body "PHOENIX_1911017.stp": height 9.2, standoff -3.8, extent -4.2,-3 4.2,4.25

## PHOENIX_1985807 [mm] "Terminal Block, 10A 63V, Pitch 3.5mm, 2 Positions, Screw Connection, Black Color"
height 8.5
pads (2):
  round 1.8 hole 1.1: 1(-1.75,0) 2(1.75,0)
Top Overlay:
  circle w0.2: c1.75,-0.05 r1.45
  circle w0.2: c-1.75,-0.05 r1.45
  lines w0.2: -3.75,-2.049 3.75,-2.049 ; -3.75,-1.566 3.75,-1.566 ; -3.75,1.487 3.75,1.487 ; -3.75,1.962 3.75,1.962 ; -3.75,-3.6 -3.75,3.7 3.75,3.7 3.75,-3.6 -3.75,-3.6
  text "1" at -1.95,2.375 h1
  text "2" at 1.45,2.375 h1
Mechanical 8:
  lines w0.1: -2.75,0 -1.75,0 ; -1.75,-1 -1.75,0 ; -1.75,1 -1.75,0 ; -1,0 0,0 ; -0.75,0 -1.75,0 ; 0,-1 0,0 ; 0,1 0,0 ; 0.75,0 1.75,0 ; 1,0 0,0 ; 1.75,-1 1.75,0 ; 1.75,1 1.75,0 ; 2.75,0 1.75,0
Mechanical 14:
  circle w0.1: c1.75,-0.05 r1.4
  circle w0.1: c-1.75,-0.05 r1.4
  circle w0.1: c1.75,-0.05 r1.45
  circle w0.1: c-1.75,-0.05 r1.45
  lines w0.1: -3.75,-2.049 3.75,-2.049 ; -3.75,-1.566 3.75,-1.566 ; -3.75,1.487 3.75,1.487 ; -3.75,1.962 3.75,1.962 ; -2.956,-0.761 -1.039,1.156 ; -2.461,-1.256 -0.544,0.661 ; 0.544,-0.761 2.461,1.156 ; 1.039,-1.256 2.956,0.661 ; -3.75,-3.6 -3.75,3.7 3.75,3.7 3.75,-3.6 -3.75,-3.6
3D body "PHOENIX_1985807.stp": height 8.5, standoff -3.5, extent -3.75,-3.6 3.75,3.7